# Altium footprint library 全库.PcbLib: 967 footprints (part 60 of 61)
Each footprint in its own frame and in the unit in brackets; x right, y up, seen from the top. Pads: shape width x height; smd on the part's side, far side on the other; paste and mask are expansions set on the pad; w line width, h text height; cw(c..) or ccw(c..) is an arc to the next point about the centre after c.
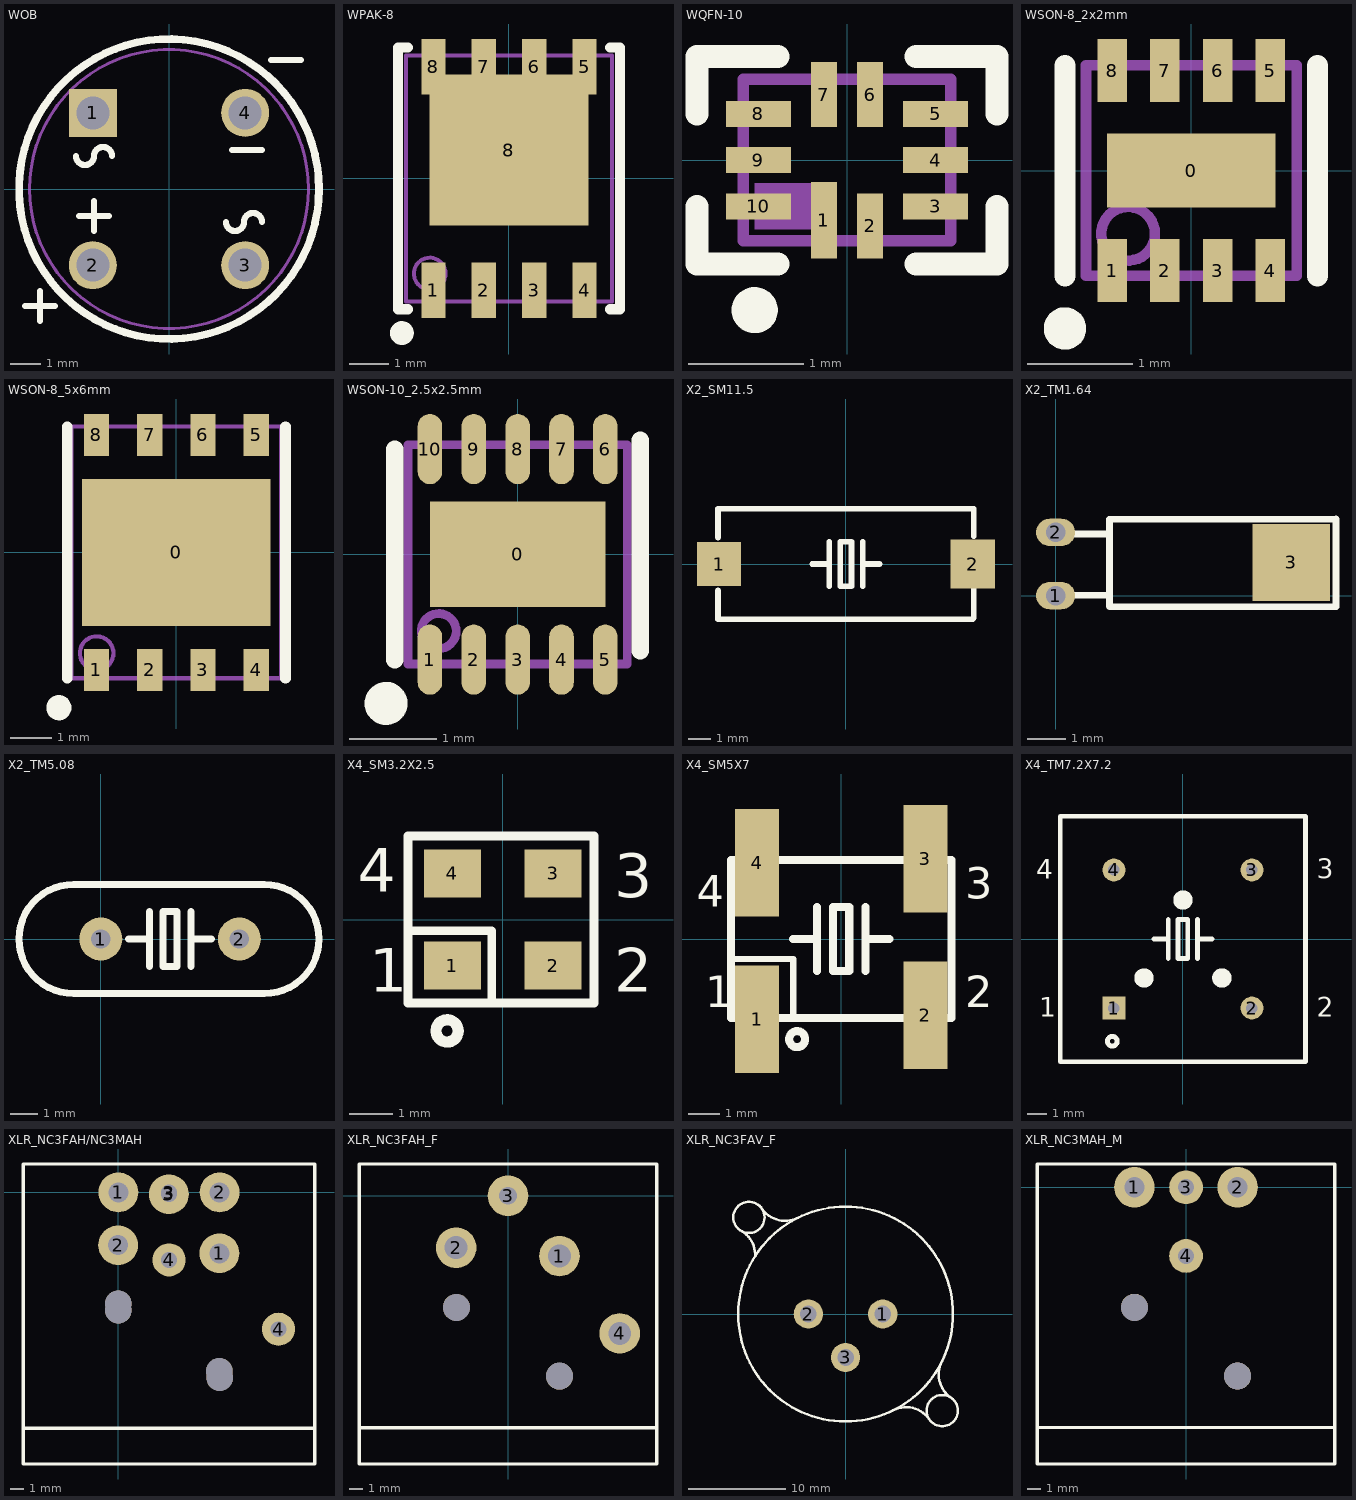
[diagram p59: the footprints below, top view; thin cyan lines are the x and y axes]

## WOB [mm]
pads (4):
  rect 1.6x1.6 hole 1.1: 1(-2.54,2.54)
  round 1.6 hole 1.1: 2(-2.54,-2.54) 3(2.54,-2.54) 4(2.54,2.54)
Top Overlay:
  circle w0.254: c0,0 r5
  lines w0.203: -4.8,-3.9 -3.8,-3.9 ; -4.3,-4.4 -4.3,-3.4 ; -3.1,1.1 ccw(c-2.8,1.1) -2.5,1.1 cw(c-2.2,1.1) -1.9,1.1 ; -3,-0.9 -2,-0.9 ; -2.5,-1.4 -2.5,-0.4 ; 1.9,-1.1 ccw(c2.2,-1.1) 2.5,-1.1 cw(c2.8,-1.1) 3.1,-1.1 ; 2.1,1.3 3.1,1.3 ; 3.4,4.3 4.4,4.3
Mechanical 13:
  circle w0.1: c0,0 r4.65

## WPAK-8 [mm]
pads (9):
  rect 0.61x1.4 smd: 1(-1.905,-2.816) 2(-0.635,-2.816) 3(0.635,-2.816) 4(1.905,-2.816) 5(1.905,2.816) 6(0.635,2.816) 7(-0.635,2.816) 8(-1.905,2.816)
  rect 4x3.81 smd: 8(0,0.716)
Top Overlay:
  circle w0.3: c-2.7,-3.9 r0.15
  lines w0.254: -2.55,-3.3 -2.8,-3.3 -2.8,3.3 -2.55,3.3 ; 2.55,-3.3 2.8,-3.3 2.8,3.3 2.55,3.3
Mechanical 13:
  circle w0.1: c-2,-2.4 r0.4
  lines w0.1: -2.6,-3.1 -2.6,3.1 2.6,3.1 2.6,-3.1 -2.6,-3.1

## WQFN-10 [mm]
pads (10):
  rect 0.225x0.663 smd mask+0.051: 1(-0.2,-0.519)
  rect 0.225x0.563 smd mask+0.051: 2(0.2,-0.569) 6(0.2,0.569) 7(-0.2,0.569)
  rect 0.563x0.225 smd mask+0.051: 3(0.768,-0.4) 4(0.768,0) 5(0.768,0.4) 8(-0.768,0.4) 9(-0.768,0) 10(-0.768,-0.4)
Top Overlay:
  circle w0.2: c-0.8,-1.3 r0.1
  lines w0.2: -1.3,-0.4 -1.3,-0.9 -0.6,-0.9 ; -1.3,0.4 -1.3,0.9 -0.6,0.9 ; 0.6,-0.9 1.3,-0.9 1.3,-0.4 ; 0.6,0.9 1.3,0.9 1.3,0.4
Mechanical 13:
  region: -0.3,-0.6 -0.3,-0.2 -0.8,-0.2 -0.8,-0.6
  lines w0.1: -0.9,-0.7 0.9,-0.7 0.9,0.7 -0.9,0.7 -0.9,-0.7

## WSON-8_2x2mm [mm]
pads (9):
  rect 1.6x0.7 smd mask+0.051: 0(0,0)
  rect 0.28x0.6 smd mask+0.051: 1(-0.75,-0.95) 2(-0.25,-0.95) 3(0.25,-0.95) 4(0.75,-0.95) 5(0.75,0.95) 6(0.25,0.95) 7(-0.25,0.95) 8(-0.75,0.95)
Top Overlay:
  circle w0.203: c-1.2,-1.5 r0.1
  lines w0.2: -1.2,-1 -1.2,1 ; 1.2,-1 1.2,1
Mechanical 13:
  circle w0.1: c-0.6,-0.6 r0.255
  lines w0.1: -1,-1 -1,1 1,1 1,-1 -1,-1

## WSON-8_5x6mm [mm]
pads (9):
  rect 4.5x3.5 smd: 0(0,0)
  rect 0.6x1 smd: 1(-1.905,-2.8) 2(-0.635,-2.8) 3(0.635,-2.8) 4(1.905,-2.8) 5(1.905,2.8) 6(0.635,2.8) 7(-0.635,2.8) 8(-1.905,2.8)
Top Overlay:
  circle w0.3: c-2.8,-3.7 r0.15
  lines w0.254: -2.6,-3 -2.6,3 ; 2.6,-3 2.6,3
Mechanical 13:
  circle w0.1: c-1.9,-2.4 r0.4
  lines w0.1: -2.5,-3 -2.5,3 2.5,3 2.5,-3 -2.5,-3

## WSON-10_2.5x2.5mm [mm]
pads (11):
  rect 2x1.2 smd mask+0.051: 0(0,0)
  oval 0.28x0.8 smd paste-0.025 mask+0.051: 1(-1,-1.2) 2(-0.5,-1.2) 3(0,-1.2) 4(0.5,-1.2) 5(1,-1.2) 6(1,1.2) 7(0.5,1.2) 8(0,1.2) 9(-0.5,1.2) 10(-1,1.2)
Top Overlay:
  circle w0.25: c-1.5,-1.7 r0.12
  lines w0.2: -1.4,-1.2 -1.4,1.2 ; 1.4,-1.1 1.4,1.3
Mechanical 13:
  circle w0.1: c-0.9,-0.875 r0.2
  lines w0.1: -1.25,-1.25 -1.25,1.25 1.25,1.25 1.25,-1.25 -1.25,-1.25

## X2_SM11.5 [mm]
pads (2):
  rect 2x2 smd: 1(-5.75,0)
  rect 2x2.2 smd: 2(5.75,0)
Top Overlay:
  lines w0.254: -5.8,-1.2 -5.8,-2.5 5.7,-2.5 ; -5.8,1.2 -5.8,2.45 ; -5.8,2.5 5.8,2.5 ; -1.524,0 -0.762,0 ; -0.762,-1.016 -0.762,1.016 ; 0.762,-1.016 0.762,1.016 ; 0.762,0 1.524,0 ; 5.75,-2.5 5.8,-2.45 5.8,-1.15 ; 5.75,2.5 5.8,2.45 5.8,1.25 ; -0.254,-1.016 0.254,-1.016 0.254,1.016 -0.254,1.016 -0.254,-1.016

## X2_TM1.64 [mil]
pads (3):
  oval 40x28 hole 20: 1(0,0) 2(0,64.57)
  rect 78.74x78.74 smd: 3(240.55,33.86)
Top Overlay:
  lines w7: 19.29,0.39 55.12,0.39 ; 20,62.99 53.94,62.99 ; 55.12,-11.02 286.22,-11.42 286.22,78.35 55.12,77.95 55.12,-11.02

## X2_TM5.08 [mil]
pads (2):
  round 62 hole 28: 1(0,0) 2(200,0)
Top Overlay:
  lines w10: 40,0 70,0 ; 70,-40 70,40 ; 130,-40 130,40 ; 130,0 160,0 ; -39.37,-78.74 cw(c-39.37,0) -39.37,78.74 236.22,78.74 cw(c236.22,0) 236.22,-78.74 -39.37,-78.74 ; 90,-40 90,40 110,40 110,-40 90,-40

## X4_SM3.2X2.5 [mm] "OSC"
pads (4):
  rect 1.3x1.1 smd: 1(-1.15,-1.05) 2(1.15,-1.05) 3(1.15,1.05) 4(-1.15,1.05)
Top Overlay:
  circle w0.254: c-1.27,-2.54 r0.254
  lines w0.2: -2.159,-0.254 -0.254,-0.254 -0.254,-1.905 ; -2.159,-1.905 2.082,-1.905 2.082,1.905 -2.159,1.905 -2.159,-1.905
  text "1" at -3.048,-1.651 h1
  text "2" at 2.54,-1.651 h1
  text "3" at 2.54,0.508 h1
  text "4" at -3.302,0.635 h1

## X4_SM5X7 [mm]
pads (4):
  rect 1.4x3.4 smd: 1(-2.667,-2.54) 2(2.667,-2.413) 3(2.667,2.54) 4(-2.667,2.413)
Top Overlay:
  circle w0.254: c-1.397,-3.175 r0.254
  lines w0.2: -3.5,-0.635 -1.524,-0.635 -1.524,-2.5
  lines w0.254: -1.524,0 -0.762,0 ; -0.762,-1.016 -0.762,1.016 ; 0.762,-1.016 0.762,1.016 ; 0.762,0 1.524,0 ; -3.5,-2.5 -3.5,2.5 3.5,2.5 3.5,-2.5 -3.5,-2.5 ; -0.254,-1.016 -0.254,1.016 0.254,1.016 0.254,-1.016 -0.254,-1.016
  text "4" at -4.572,1.016 h1
  text "3" at 3.937,1.27 h1
  text "2" at 3.937,-2.159 h1
  text "1" at -4.318,-2.159 h1

## X4_TM7.2X7.2 [mm]
pads (4):
  rect 1.2x1.2 hole 0.6: 1(-3.6,-3.6)
  round 1.2 hole 0.6: 2(3.6,-3.6) 3(3.6,3.6) 4(-3.6,3.6)
Top Overlay:
  circle w0.5: c0,2.032 r0.254
  circle w0.5: c2.032,-2.032 r0.254
  circle w0.5: c-2.032,-2.032 r0.254
  circle w0.254: c-3.683,-5.334 r0.254
  lines w0.254: -1.524,0 -0.762,0 ; -0.762,-1.016 -0.762,1.016 ; 0.762,-1.016 0.762,1.016 ; 0.762,0 1.524,0 ; -6.4,-6.4 -6.4,6.4 6.4,6.4 6.4,-6.4 -6.4,-6.4 ; -0.254,-1.016 -0.254,1.016 0.254,1.016 0.254,-1.016 -0.254,-1.016
  text "4" at -7.664,3.131 h1
  text "3" at 6.985,3.175 h1
  text "2" at 6.985,-4.064 h1
  text "1" at -7.493,-4.064 h1

## XLR_NC3FAH/NC3MAH [mm]
pads (12):
  round 3 hole 1.5: 1(0,0) 1(7.62,-4.6) 2(-0.026,-3.981) 2(7.63,0)
  round 3 hole 1.2: 3(3.81,-0.14)
  round 2.5 hole 1.2: 3(3.82,-0.01) 4(3.82,-5.09) 4(12.078,-10.322)
  round 2 hole 2 unplated: ""(-0.01,-8.4) ""(0,-8.89) ""(7.62,-13.49) ""(7.63,-13.98)
Top Overlay:
  lines w0.254: -7.19,-17.79 14.81,-17.79 -7.19,-17.79 ; -7.18,-20.49 14.82,-20.49 14.82,1.22 14.82,2.14 -7.18,2.14 -7.18,-20.49

## XLR_NC3FAH_F [mm]
pads (6):
  round 3 hole 1.7: 1(3.81,-4.46) 2(-3.836,-3.841) 4(8.268,-10.182)
  round 3 hole 1.3: 3(0,0)
  round 2 hole 2 unplated: ""(-3.82,-8.26) ""(3.81,-13.35)
Top Overlay:
  lines w0.254: -11,-17.15 11,-17.15 ; -11,-19.845 11,-19.845 11,2.35 -11,2.35 -11,-19.845

## XLR_NC3FAV_F [mm]
pads (3):
  round 3 hole 1.7: 1(3.81,0) 2(-3.81,0) 3(0,-4.45)
Top Overlay:
  circle w0.254: c0,0 r11
  circle w0.254: c-9.9,9.9 r1.6
  circle w0.254: c9.9,-9.9 r1.6
  lines w0.254: -10.823,8.605 cw(c-12.162,6.021) -9.254,5.918 ; -8.661,10.922 ccw(c-6.19,12.459) -4.851,9.876 ; 4.846,-9.869 cw(c6.186,-12.453) 8.56,-10.77 ; 9.881,-4.826 ccw(c12.454,-6.185) 10.924,-8.661

## XLR_NC3MAH_M [mm]
pads (6):
  round 3 hole 1.5: 1(-3.82,0.01) 2(3.81,0.01)
  round 2.5 hole 1.2: 3(0,0) 4(0,-5.08)
  round 2 hole 2 unplated: ""(-3.82,-8.88) ""(3.81,-13.97)
Top Overlay:
  lines w0.254: -11.01,-17.78 10.99,-17.78 ; -11,-20.48 -11,1.725 11,1.725 11,-20.48 -11,-20.48